# Altium footprint library DrPCB.PcbLib: 910 footprints (part 37 of 57)
Each footprint in its own frame and in the unit in brackets; x right, y up, seen from the top. Pads: shape width x height; smd on the part's side, far side on the other; paste and mask are expansions set on the pad; w line width, h text height; cw(c..) or ccw(c..) is an arc to the next point about the centre after c.
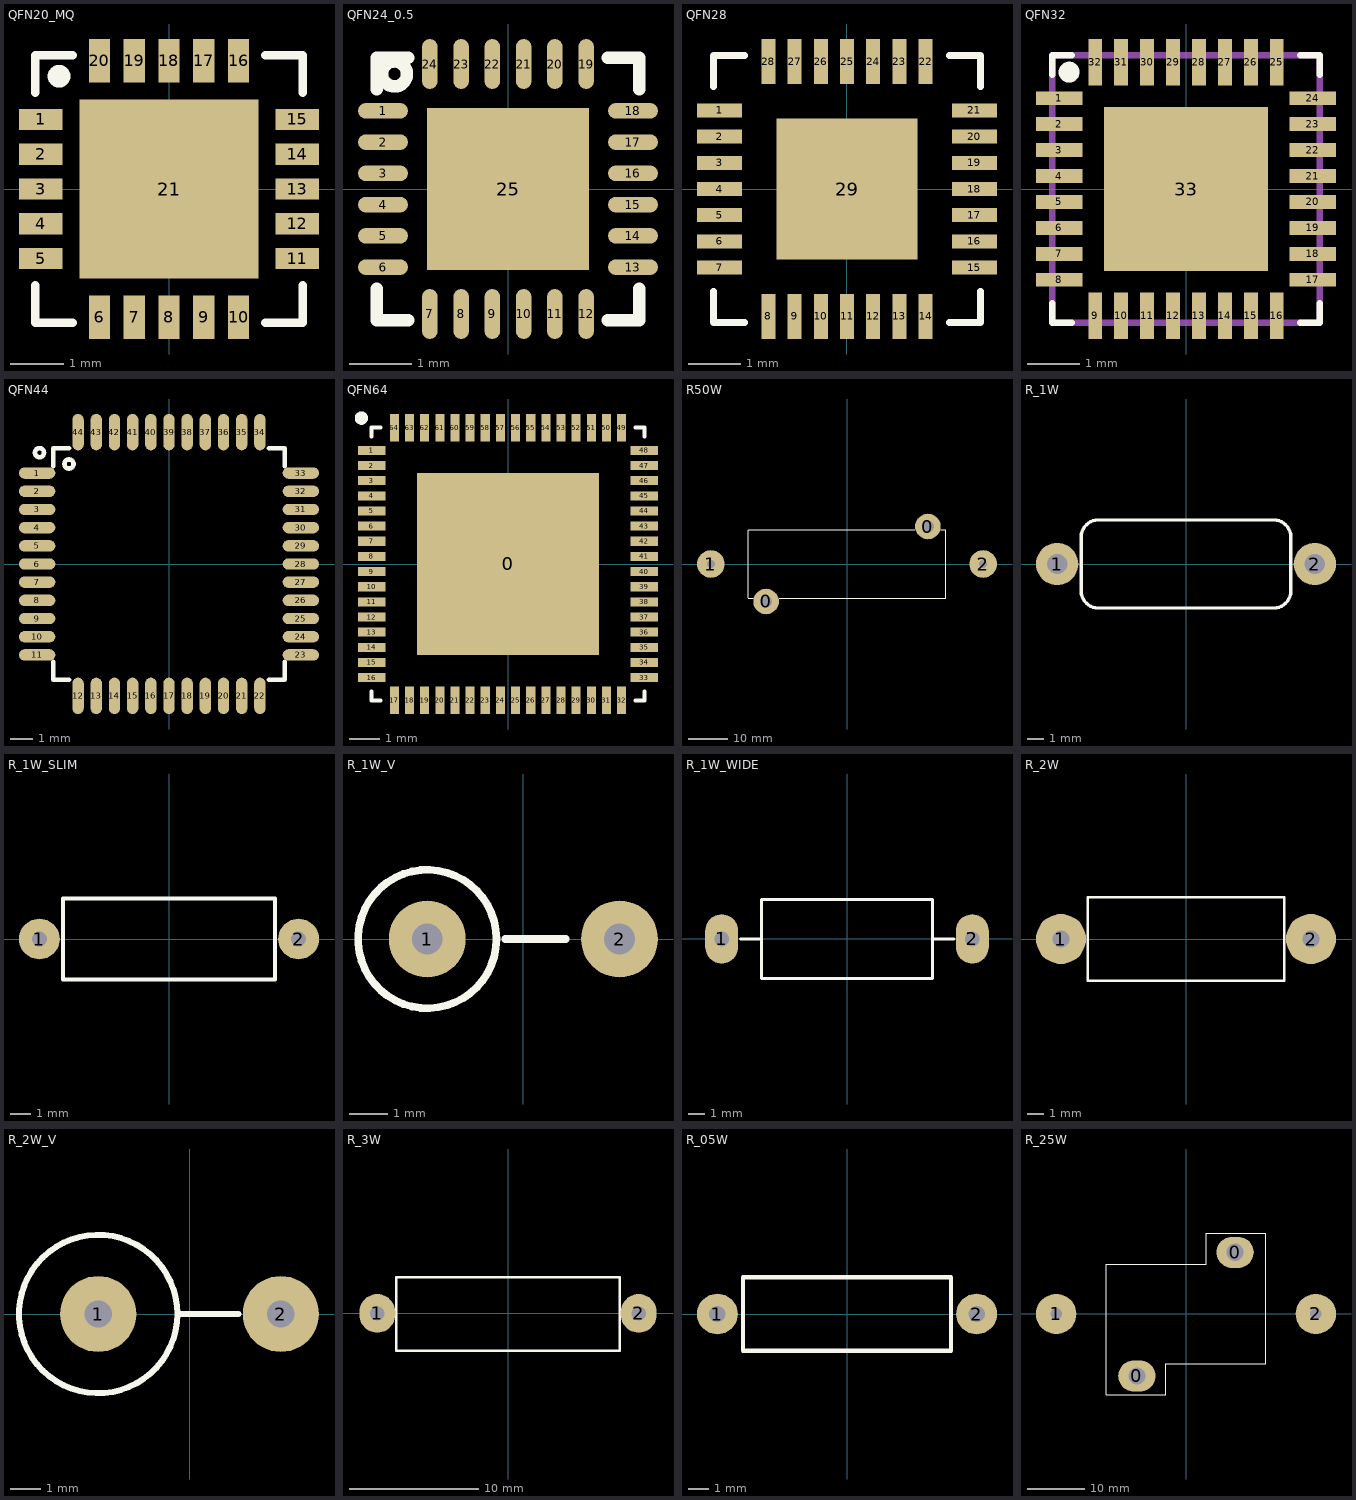
[diagram p36: the footprints below, top view; thin cyan lines are the x and y axes]

## QFN20_MQ [mm]
pads (21):
  rect 0.813x0.4 smd: 1(-2.398,1.3) 2(-2.398,0.65) 3(-2.398,0) 4(-2.398,-0.65) 5(-2.398,-1.3) 11(2.398,-1.3) 12(2.398,-0.65) 13(2.398,0) 14(2.398,0.65) 15(2.398,1.3)
  rect 0.4x0.813 smd: 6(-1.3,-2.398) 7(-0.65,-2.398) 8(0,-2.398) 9(0.65,-2.398) 10(1.3,-2.398) 16(1.3,2.398) 17(0.65,2.398) 18(0,2.398) 19(-0.65,2.398) 20(-1.3,2.398)
  rect 3.35x3.35 smd: 21(0,0)
Top Overlay:
  circle w0.254: c-2.057,2.108 r0.085
  lines w0.152: -2.5,-1.8 -2.5,-2.5 -1.8,-2.5 ; -2.5,1.8 -2.5,2.5 -1.8,2.5 ; 1.8,-2.5 2.5,-2.5 2.5,-1.8 ; 1.8,2.5 2.5,2.5 2.5,1.8
3D body "QFN20_5x5MC.step": height 0.96, standoff 0.01, extent -2.5,-2.5 2.5,2.5

## QFN24_0.5 [mm] "RTW, RGE S-PQFP-N24 (TI), HVQFN24, 4X4mm, 0.5mm, MO-220 (JEDEC)"
height 1
pads (25):
  oval 0.8x0.25 smd mask+0.05: 1(-2,1.25) 2(-2,0.75) 3(-2,0.25) 4(-2,-0.25) 5(-2,-0.75) 6(-2,-1.25) 13(2,-1.25) 14(2,-0.75) 15(2,-0.25) 16(2,0.25) 17(2,0.75) 18(2,1.25)
  oval 0.25x0.8 smd mask+0.05: 7(-1.25,-2) 8(-0.75,-2) 9(-0.25,-2) 10(0.25,-2) 11(0.75,-2) 12(1.25,-2) 19(1.25,2) 20(0.75,2) 21(0.25,2) 22(-0.25,2) 23(-0.75,2) 24(-1.25,2)
  rect 2.6x2.6 smd paste-2 mask+0.05: 25(0,0)
Top Overlay:
  circle w0.2: c-1.816,1.841 r0.2
  lines w0.2: -2.1,-1.6 -2.1,-2.1 -1.6,-2.1 ; -2.1,1.6 -2.1,2.1 -1.6,2.1 ; 1.6,-2.1 2.1,-2.1 2.1,-1.6 ; 1.6,2.1 2.1,2.1 2.1,1.6
Top Paste:
  rectangle: -1.1,0.2 -0.2,1.1
  region: 1.1,1.1 0.2,1.1 0.2,0.2 1.1,0.2
  region: 1.1,-0.2 0.2,-0.2 0.2,-1.1 1.1,-1.1
  rectangle: -1.1,-1.1 -0.2,-0.2
3D body "RTW0024H.stp": height 0.8, standoff 0, extent -2,-2 2,2

## QFN28 [mm]
pads (29):
  rect 0.86x0.27 smd paste-0.05: 1(-2.435,1.5) 2(-2.435,1) 3(-2.435,0.5) 4(-2.435,0) 5(-2.435,-0.5) 6(-2.435,-1) 7(-2.435,-1.5) 15(2.435,-1.5) 16(2.435,-1) 17(2.435,-0.5) 18(2.435,0) 19(2.435,0.5) 20(2.435,1) 21(2.435,1.5)
  rect 0.27x0.86 smd paste-0.05: 8(-1.5,-2.435) 9(-1,-2.435) 10(-0.5,-2.435) 11(0,-2.435) 12(0.5,-2.435) 13(1,-2.435) 14(1.5,-2.435) 22(1.5,2.435) 23(1,2.435) 24(0.5,2.435) 25(0,2.435) 26(-0.5,2.435) 27(-1,2.435) 28(-1.5,2.435)
  rect 2.7x2.7 smd paste-0.3: 29(0,0)
Top Overlay:
  lines w0.127: -2.55,-1.955 -2.55,-2.55 -1.955,-2.55 ; -2.55,1.955 -2.55,2.55 -1.955,2.55 ; 1.955,-2.55 2.55,-2.55 2.55,-1.955 ; 1.955,2.55 2.55,2.55 2.55,1.955
Top Paste:
  region: -0.85,0.85 0.85,0.85 0.85,-0.85 -0.85,-0.85
3D body "User Library-QFN28-0_5.STEP": height 1.01, standoff 0.01, extent -2.5,-2.5 2.5,2.5

## QFN32 [mm]
pads (33):
  rect 0.89x0.26 smd: 1(-2.44,1.75) 2(-2.44,1.25) 3(-2.44,0.75) 4(-2.44,0.25) 5(-2.44,-0.25) 6(-2.44,-0.75) 7(-2.44,-1.25) 8(-2.44,-1.75) 17(2.44,-1.75) 18(2.44,-1.25) 19(2.44,-0.75) 20(2.44,-0.25) 21(2.44,0.25) 22(2.44,0.75) 23(2.44,1.25) 24(2.44,1.75)
  rect 0.26x0.89 smd: 9(-1.75,-2.44) 10(-1.25,-2.44) 11(-0.75,-2.44) 12(-0.25,-2.44) 13(0.25,-2.44) 14(0.75,-2.44) 15(1.25,-2.44) 16(1.75,-2.44) 25(1.75,2.44) 26(1.25,2.44) 27(0.75,2.44) 28(0.25,2.44) 29(-0.25,2.44) 30(-0.75,2.44) 31(-1.25,2.44) 32(-1.75,2.44)
  rect 3.15x3.15 smd: 33(0,0)
Top Overlay:
  circle w0.2: c-2.248,2.248 r0.1
  lines w0.127: -2.575,-2.2 -2.575,-2.575 -2.2,-2.575 ; -2.575,2.2 -2.575,2.575 -2.2,2.575 ; 2.2,-2.575 2.575,-2.575 2.575,-2.2 ; 2.2,2.575 2.575,2.575 2.575,2.2
Top Paste:
  region: -1,1 1,1 1,-1 -1,-1
Mechanical 4:
  lines w0.127: -2.575,-2.575 -2.575,2.575 ; -2.575,-2.575 2.575,-2.575 ; -2.575,-2.575 -2.575,2.575 ; -2.575,-2.575 2.575,-2.575 ; -2.575,2.575 2.575,2.575 ; -2.575,2.575 2.575,2.575 ; 2.575,-2.575 2.575,2.575 ; 2.575,-2.575 2.575,2.575
3D body "User Library-QFN32-1.step": height 0.94, standoff 0.01, extent -2.5,-2.5 2.5,2.5

## QFN44 [mm]
height 2.3
pads (44):
  oval 1.6x0.5 smd mask+0.075: 1(-5.8,4) 2(-5.8,3.2) 3(-5.8,2.4) 4(-5.8,1.6) 5(-5.8,0.8) 6(-5.8,0) 7(-5.8,-0.8) 8(-5.8,-1.6) 9(-5.8,-2.4) 10(-5.8,-3.2) 11(-5.8,-4) 23(5.8,-4) 24(5.8,-3.2) 25(5.8,-2.4) 26(5.8,-1.6) 27(5.8,-0.8) 28(5.8,0) 29(5.8,0.8) 30(5.8,1.6) 31(5.8,2.4) 32(5.8,3.2) 33(5.8,4)
  oval 0.5x1.6 smd mask+0.075: 12(-4,-5.8) 13(-3.2,-5.8) 14(-2.4,-5.8) 15(-1.6,-5.8) 16(-0.8,-5.8) 17(0,-5.8) 18(0.8,-5.8) 19(1.6,-5.8) 20(2.4,-5.8) 21(3.2,-5.8) 22(4,-5.8) 34(4,5.8) 35(3.2,5.8) 36(2.4,5.8) 37(1.6,5.8) 38(0.8,5.8) 39(0,5.8) 40(-0.8,5.8) 41(-1.6,5.8) 42(-2.4,5.8) 43(-3.2,5.8) 44(-4,5.8)
Top Overlay:
  circle w0.2: c-4.4,4.4 r0.2
  circle w0.2: c-5.7,4.9 r0.2
  lines w0.2: -5.1,-4.3 -5.1,-5.1 -4.4,-5.1 ; -5.1,4.3 -5.1,5.1 -4.4,5.1 ; 4.4,-5.1 5.1,-5.1 5.1,-4.3 ; 4.4,5.1 5.1,5.1 5.1,4.3
3D body "lqfp44-sot389-1.STEP": height 1.45, standoff -0.06, extent -6.075,-6.038 6,6.038

## QFN64 [mm]
pads (65):
  rect 6x6 smd mask+0: 0(0,0)
  rect 0.9x0.3 smd mask+0.05: 1(-4.5,3.75) 2(-4.5,3.25) 3(-4.5,2.75) 4(-4.5,2.25) 5(-4.5,1.75) 6(-4.5,1.25) 7(-4.5,0.75) 8(-4.5,0.25) 9(-4.5,-0.25) 10(-4.5,-0.75) 11(-4.5,-1.25) 12(-4.5,-1.75) 13(-4.5,-2.25) 14(-4.5,-2.75) 15(-4.5,-3.25) 16(-4.5,-3.75) 33(4.5,-3.75) 34(4.5,-3.25) 35(4.5,-2.75) 36(4.5,-2.25) 37(4.5,-1.75) 38(4.5,-1.25) 39(4.5,-0.75) 40(4.5,-0.25) 41(4.5,0.25) 42(4.5,0.75) 43(4.5,1.25) 44(4.5,1.75) 45(4.5,2.25) 46(4.5,2.75) 47(4.5,3.25) 48(4.5,3.75)
  rect 0.3x0.9 smd mask+0.05: 17(-3.75,-4.5) 18(-3.25,-4.5) 19(-2.75,-4.5) 20(-2.25,-4.5) 21(-1.75,-4.5) 22(-1.25,-4.5) 23(-0.75,-4.5) 24(-0.25,-4.5) 25(0.25,-4.5) 26(0.75,-4.5) 27(1.25,-4.5) 28(1.75,-4.5) 29(2.25,-4.5) 30(2.75,-4.5) 31(3.25,-4.5) 32(3.75,-4.5) 49(3.75,4.5) 50(3.25,4.5) 51(2.75,4.5) 52(2.25,4.5) 53(1.75,4.5) 54(1.25,4.5) 55(0.75,4.5) 56(0.25,4.5) 57(-0.25,4.5) 58(-0.75,4.5) 59(-1.25,4.5) 60(-1.75,4.5) 61(-2.25,4.5) 62(-2.75,4.5) 63(-3.25,4.5) 64(-3.75,4.5)
Top Overlay:
  circle w0.254: c-4.839,4.813 r0.092
  lines w0.127: -4.5,-4.2 -4.5,-4.5 -4.2,-4.5 ; -4.5,4.2 -4.5,4.5 -4.2,4.5 ; 4.2,-4.5 4.5,-4.5 4.5,-4.2 ; 4.2,4.5 4.5,4.5 4.5,4.2
3D body "User Library-QFN64-2.step": height 0.91, standoff 0.01, extent -4.52,-4.52 4.52,4.52

## R50W [mm]
pads (4):
  round 6.5 hole 3: 0(-20.5,-9.5) 0(20.5,9.5)
  round 7 hole 2: 1(-34.5,0) 2(34.5,0)
Top Overlay:
  lines w0.254: -25.023,-8.623 -23.785,-8.623 ; -25.023,8.617 17.196,8.617 ; -17.196,-8.623 25.023,-8.623 ; 23.785,8.617 25.023,8.617
  lines w0.3: -25,-8.6 -25,8.594 ; 24.994,8.6 25,8.594 25,-8.6

## R_1W [mm] "RESISTOR 1 WATT, AXIAL0.6"
height 5
pads (2):
  round 2.5 hole 1.2: 1(-7.62,0) 2(7.62,0)
Top Overlay:
  lines w0.2: -6.2,-1.6 ccw(c-5.2,-1.6) -5.2,-2.6 5.2,-2.6 ccw(c5.2,-1.6) 6.2,-1.6 6.2,1.6 ccw(c5.2,1.6) 5.2,2.6 -5.2,2.6 ccw(c-5.2,1.6) -6.2,1.6 -6.2,-1.6
3D body "User Library-RES-1W.STEP": height 5, standoff -3, extent -7.97,-2.494 7.97,2.506

## R_1W_SLIM [mm] "RESISTOR 1 WATT, AXIAL0.6"
height 5
pads (2):
  round 2 hole 0.75: 1(-6.35,0) 2(6.35,0)
Top Overlay:
  lines w0.2: -5.2,-1.99 -5.2,1.99 5.2,1.99 5.2,-1.99 -5.2,-1.99
3D body "User Library-Res50-Axial 0_5W-10K.step": height 3.88, standoff -5.5, extent -6.725,-1.875 6.725,1.875

## R_1W_V [mm] "RESISTOR 2 WATT, AXIAL0.8"
height 5.5
pads (2):
  round 2 hole 0.8: 1(-2.5,0) 2(2.5,0)
Top Overlay:
  circle w0.2: c-2.5,0 r1.8
  lines w0.2: -0.47,0 1.1,0
3D body "User Library-RESISTOR_2W.step": height 12.74, standoff -3, extent -4.161,-1.753 2.993,1.755

## R_1W_WIDE [mm] "RESISTOR 1 WATT, AXIAL0.6"
height 5
pads (2):
  oval 2x3 hole 0.9: 1(-7.62,0) 2(7.62,0)
Top Overlay:
  lines w0.2: -6.477,0 -5.2,0 ; 5.225,-0.006 6.502,-0.006 ; -5.2,-2.413 5.2,-2.413 5.2,2.4 -5.2,2.4 -5.2,-2.413
3D body "User Library-RES-1W.STEP": height 5, standoff -3, extent -7.97,-2.5 7.97,2.5

## R_2W [mm]
pads (2):
  round 3 hole 1: 1(-7.5,0) 2(7.5,0)
Top Overlay:
  lines w0.15: -5.9,-2.5 -5.9,2.5 5.88,2.5 ; -5.88,-2.5 5.9,-2.5 5.9,2.5
3D body "User Library-Resistor_Carvao_2W.STEP": height 4.5, standoff -3.5, extent -8.02,-2 8.02,2

## R_2W_V [mm] "RESISTOR 2 WATT, AXIAL0.8"
height 5.5
pads (2):
  round 2.5 hole 0.9: 1(-3,0) 2(3,0)
Top Overlay:
  circle w0.2: c-3,0 r2.6
  lines w0.2: -0.309,0 1.6,0
3D body "User Library-User Library-RES-1W_stand_up_6mm.step": height 14.47, standoff -5, extent -5.425,-2.5 3.425,2.5

## R_3W [mm] "RESISTOR 2 WATT, AXIAL0.8"
height 5.5
pads (2):
  oval 2.8x3 hole 1.1: 1(-10.16,0) 2(10.16,0)
Top Overlay:
  lines w0.2: -8.7,-2.9 8.7,-2.9 8.7,2.8 -8.7,2.8 -8.7,-2.9
3D body "User Library-RES-2W.STEP": height 5.5, standoff -3, extent -10.51,-2.8 10.51,2.7

## R_05W [mm] "RESISTOR 0.5 WATT, AXIAL0.5"
height 3.5
pads (2):
  round 2 hole 0.8: 1(-6.35,0) 2(6.35,0)
Top Overlay:
  lines w0.2: -5.1,-1.8 5.1,-1.8 5.1,1.8 -5.1,1.8 -5.1,-1.8
3D body "User Library-RES-1_5W.STEP": height 3.5, standoff -3, extent -6.62,-1.75 6.62,1.75

## R_25W [mm]
pads (4):
  oval 6.5x5.4 hole 3: 0(-8.5,-10.75) 0(8.496,10.681)
  round 7 hole 2: 1(-22.5,0) 2(22.5,0)
Top Overlay:
  lines w0.2: -13.818,-13.983 -3.5,-13.983 -3.5,-8.65 13.856,-8.65 13.856,13.983 3.5,13.983 3.5,8.595 -13.818,8.595 -13.818,-13.983
3D body "User Library-Aluminium Housed Power Resistors 25W.step": height 13.43, standoff 0, extent -23.7,-13.85 23.7,13.85